# Altium footprint library MyComponents_v2.5.PcbLib: 403 footprints (part 26 of 26)
Each footprint in its own frame and in the unit in brackets; x right, y up, seen from the top. Pads: shape width x height; smd on the part's side, far side on the other; paste and mask are expansions set on the pad; w line width, h text height; cw(c..) or ccw(c..) is an arc to the next point about the centre after c.
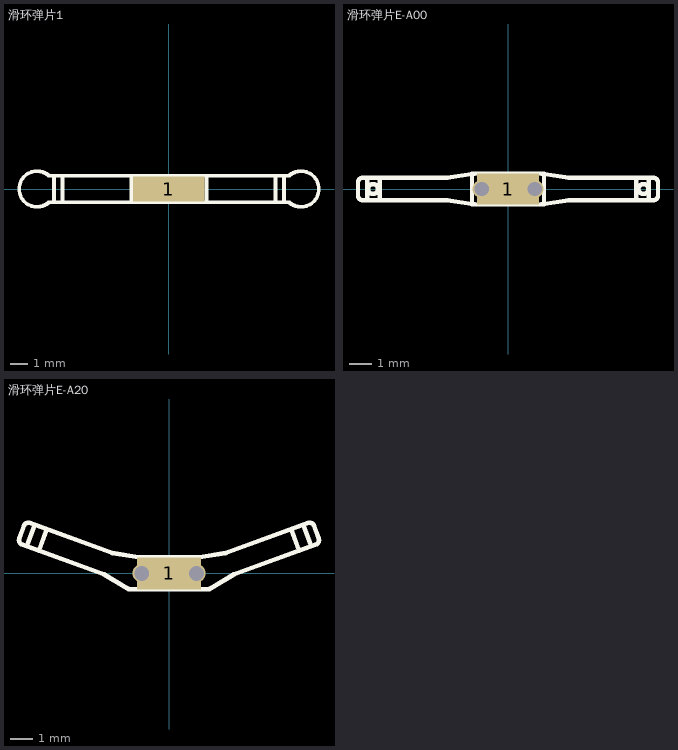
[diagram p25: the footprints below, top view; thin cyan lines are the x and y axes]

## 滑环弹片1 [mm]
pads (1):
  rect 4x1.4 smd: 1(0,0)
Top Overlay:
  circle w0.2: c0.007,0 r0.4
  lines w0.2: -7.369,-1 -7.33,-1 ccw(c-7.332,-0.036) -6.684,-0.75 ; -7.369,1 -7.33,1 cw(c-7.331,0.038) -6.684,0.75 ; -6.408,-0.75 -6.408,0.75 ; -5.934,-0.75 -5.934,0.75 ; -2.089,-0.75 -2.089,0.75 ; -1.867,-0.75 -1.867,0.75 ; 1.88,-0.75 1.88,0.75 ; 2.102,-0.75 2.102,0.75 ; 5.948,-0.75 5.948,0.75 ; 6.422,-0.75 6.422,0.75 ; 6.697,-0.75 ccw(c7.344,-0.038) 7.343,-1 7.382,-1 ; 6.697,0.75 cw(c7.345,0.036) 7.343,1 7.382,1 ; -6.723,-0.75 cw(c-7.371,0) -6.723,0.75 6.736,0.75 cw(c7.384,0) 6.736,-0.75 -6.723,-0.75
3D body "弹片1-弯折.S": height 1.46, standoff -0.01, extent -8.351,-1 8.352,1

## 滑环弹片E-A00 [mm]
pads (1):
  rect 2.8x1.4 smd: 1(0,0)
via -1.2,0 diameter 0.8 hole 0.65
via 1.2,0 diameter 0.8 hole 0.65
Top Overlay:
  drawing of 660 lines, arcs and shapes, not listed
3D body "PCB弹片E-A00_压折.S": height 1.24, standoff -0.01, extent -6.745,-0.7 6.795,0.7

## 滑环弹片E-A20 [mm]
pads (1):
  rect 2.8x1.4 smd: 1(0,0)
via 1.2,0 diameter 0.8 hole 0.65
via -1.2,0 diameter 0.8 hole 0.65
Top Overlay:
  drawing of 2450 lines, arcs and shapes, not listed
3D body "PCB弹片E-A20_压折.S": height 1.22, standoff -0.01, extent -6.568,-0.694 6.568,2.225